# Altium footprint library EMDC_Packages.PcbLib: 274 footprints (part 10 of 18)
Each footprint in its own frame and in the unit in brackets; x right, y up, seen from the top. Pads: shape width x height; smd on the part's side, far side on the other; paste and mask are expansions set on the pad; w line width, h text height; cw(c..) or ccw(c..) is an arc to the next point about the centre after c.
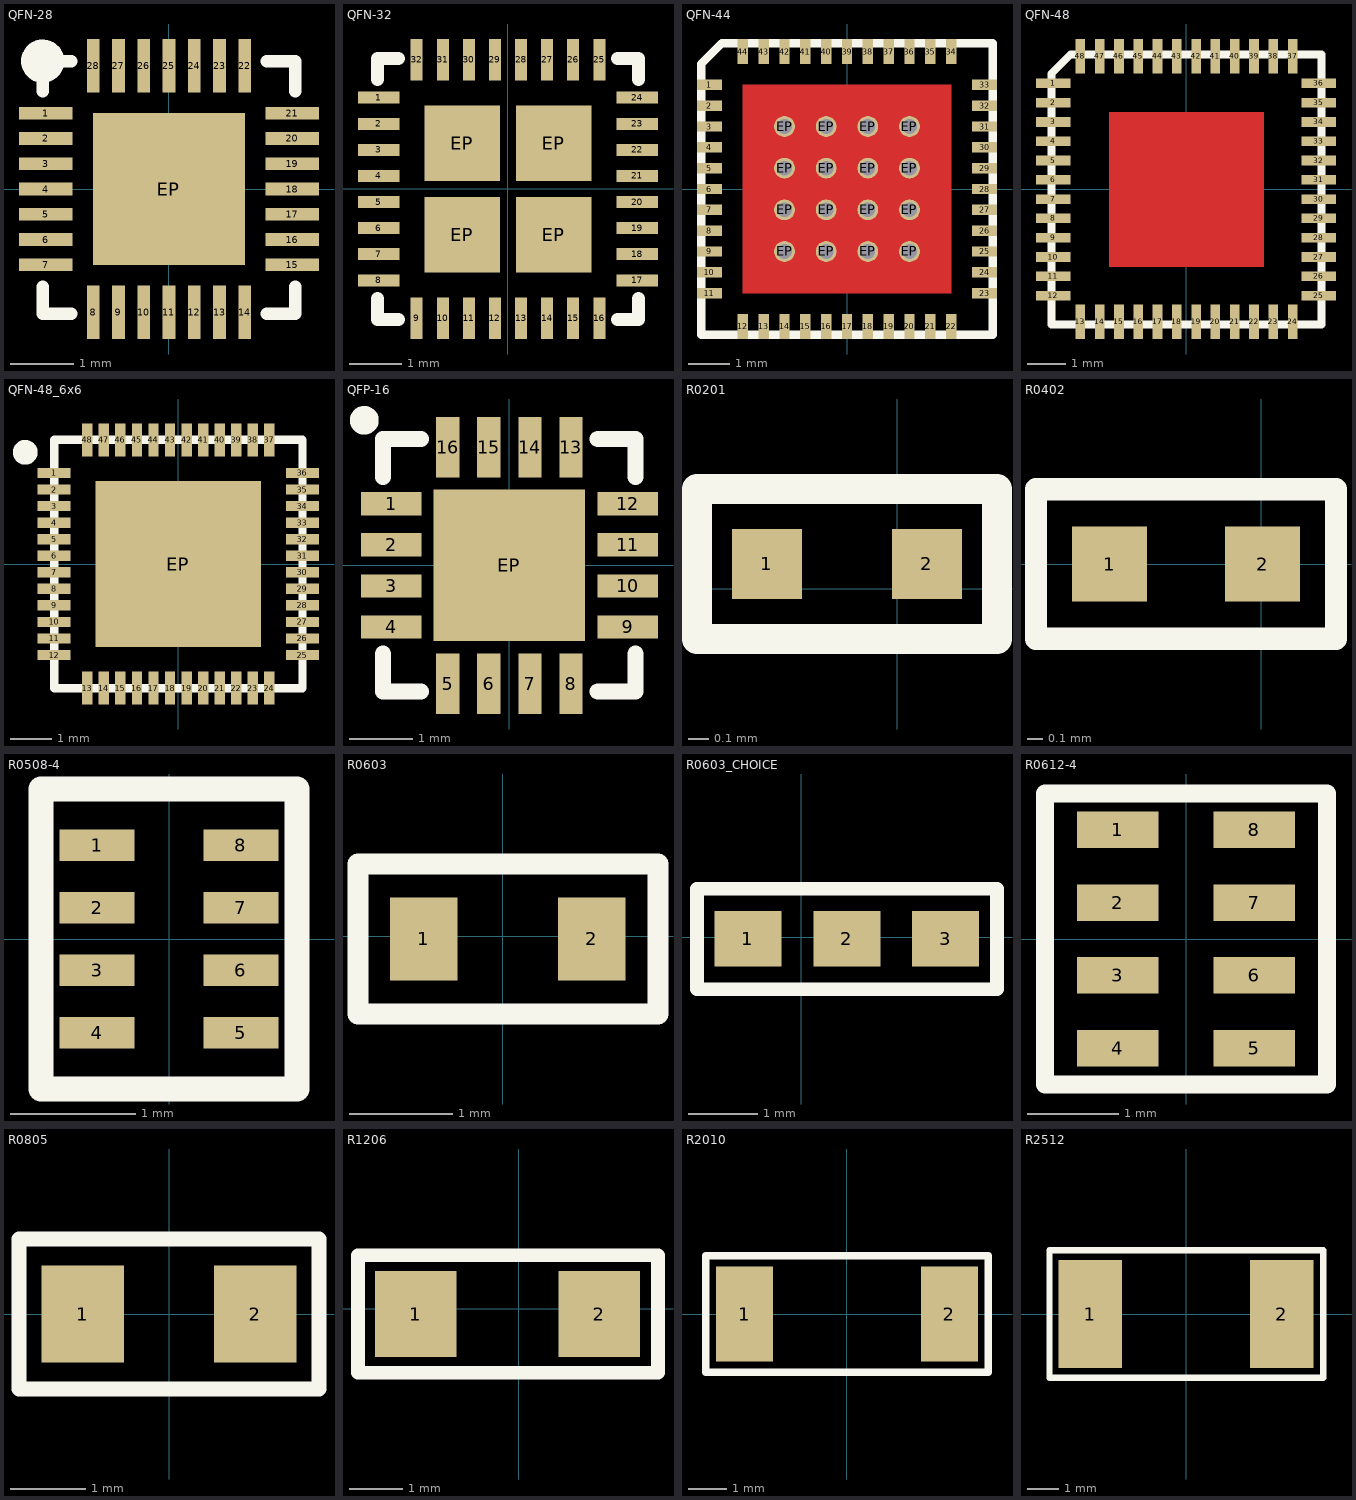
[diagram p9: the footprints below, top view; thin cyan lines are the x and y axes]

## QFN-28 [mm] "QFN-28"
pads (29):
  rect 0.85x0.2 smd: 1(-1.95,1.2) 2(-1.95,0.8) 3(-1.95,0.4) 4(-1.95,0) 5(-1.95,-0.4) 6(-1.95,-0.8) 7(-1.95,-1.2) 15(1.95,-1.2) 16(1.95,-0.8) 17(1.95,-0.4) 18(1.95,0) 19(1.95,0.4) 20(1.95,0.8) 21(1.95,1.2)
  rect 0.2x0.85 smd: 8(-1.2,-1.95) 9(-0.8,-1.95) 10(-0.4,-1.95) 11(0,-1.95) 12(0.4,-1.95) 13(0.8,-1.95) 14(1.2,-1.95) 22(1.2,1.95) 23(0.8,1.95) 24(0.4,1.95) 25(0,1.95) 26(-0.4,1.95) 27(-0.8,1.95) 28(-1.2,1.95)
  rect 2.4x2.4 smd: EP(0,0)
Top Overlay:
  circle w0.254: c-2,2.025 r0.215
  lines w0.2: -2,-1.55 -2,-1.975 -1.55,-1.975 ; -2,1.55 -2,2.025 -1.55,2.025 ; 1.55,-1.975 2,-1.975 2,-1.55 ; 1.55,2.025 2,2.025 2,1.55
3D body "User Library-QFN28-0_4.STEP": height 0.75, standoff 0, extent -2,-1.975 2,2.025

## QFN-32 [mm]
pads (36):
  rect 0.8x0.23 smd: 1(-2.475,1.75) 2(-2.475,1.25) 3(-2.475,0.75) 4(-2.475,0.25) 5(-2.475,-0.25) 6(-2.475,-0.75) 7(-2.475,-1.25) 8(-2.475,-1.75) 17(2.475,-1.75) 18(2.475,-1.25) 19(2.475,-0.75) 20(2.475,-0.25) 21(2.475,0.25) 22(2.475,0.75) 23(2.475,1.25) 24(2.475,1.75)
  rect 0.23x0.8 smd: 9(-1.75,-2.475) 10(-1.25,-2.475) 11(-0.75,-2.475) 12(-0.25,-2.475) 13(0.25,-2.475) 14(0.75,-2.475) 15(1.25,-2.475) 16(1.75,-2.475) 25(1.75,2.475) 26(1.25,2.475) 27(0.75,2.475) 28(0.25,2.475) 29(-0.25,2.475) 30(-0.75,2.475) 31(-1.25,2.475) 32(-1.75,2.475)
  rect 1.45x1.45 smd: EP(-0.875,-0.875) EP(-0.875,0.875) EP(0.875,-0.875) EP(0.875,0.875)
Top Overlay:
  lines w0.254: -2.5,-2.1 -2.5,-2.5 -2.1,-2.5 ; -2.5,2.1 -2.5,2.5 -2.1,2.5 ; 2.1,-2.5 2.5,-2.5 2.5,-2.1 ; 2.1,2.5 2.5,2.5 2.5,2.1
3D body "User Library-QFN-32-5x5 - EQ.STEP": height 0.85, standoff 0, extent -2.5,-2.5 2.5,2.5

## QFN-44 [mm] "QFN 44pin 7x7mm"
pads (60):
  rect 0.6x0.25 smd: 1(-3.3,2.5) 2(-3.3,2) 3(-3.3,1.5) 4(-3.3,1) 5(-3.3,0.5) 6(-3.3,0) 7(-3.3,-0.5) 8(-3.3,-1) 9(-3.3,-1.5) 10(-3.3,-2) 11(-3.3,-2.5) 23(3.3,-2.5) 24(3.3,-2) 25(3.3,-1.5) 26(3.3,-1) 27(3.3,-0.5) 28(3.3,0) 29(3.3,0.5) 30(3.3,1) 31(3.3,1.5) 32(3.3,2) 33(3.3,2.5)
  rect 0.25x0.6 smd: 12(-2.5,-3.3) 13(-2,-3.3) 14(-1.5,-3.3) 15(-1,-3.3) 16(-0.5,-3.3) 17(0,-3.3) 18(0.5,-3.3) 19(1,-3.3) 20(1.5,-3.3) 21(2,-3.3) 22(2.5,-3.3) 34(2.5,3.3) 35(2,3.3) 36(1.5,3.3) 37(1,3.3) 38(0.5,3.3) 39(0,3.3) 40(-0.5,3.3) 41(-1,3.3) 42(-1.5,3.3) 43(-2,3.3) 44(-2.5,3.3)
  round 0.5 hole 0.35 paste+0 mask+0: EP(-1.5,-1.5) EP(-1.5,-0.5) EP(-1.5,0.5) EP(-1.5,1.5) EP(-0.5,-1.5) EP(-0.5,-0.5) EP(-0.5,0.5) EP(-0.5,1.5) EP(0.5,-1.5) EP(0.5,-0.5) EP(0.5,0.5) EP(0.5,1.5) EP(1.5,-1.5) EP(1.5,-0.5) EP(1.5,0.5) EP(1.5,1.5)
Top Layer:
  region: -2.5,2.5 -2.5,-2.5 2.5,-2.5 2.5,2.5
Top Overlay:
  lines w0.2: -3.5,-3.5 -3.5,3 -3,3.5 3.5,3.5 3.5,-3.5 -3.5,-3.5
Top Solder:
  region: -1.23,2.16 -2.16,2.16 -2.16,1.23 -1.23,1.23
  region: -0.1,1.23 -0.1,2.16 -1.03,2.16 -1.03,1.23
  region: 1.03,1.23 1.03,2.16 0.1,2.16 0.1,1.23
  region: 2.16,1.23 2.16,2.16 1.23,2.16 1.23,1.23
  region: -1.23,0.1 -1.23,1.03 -2.16,1.03 -2.16,0.1
  region: -0.1,0.1 -0.1,1.03 -1.03,1.03 -1.03,0.1
  region: 1.03,0.1 1.03,1.03 0.1,1.03 0.1,0.1
  region: 2.16,0.1 2.16,1.03 1.23,1.03 1.23,0.1
  region: -1.23,-1.03 -1.23,-0.1 -2.16,-0.1 -2.16,-1.03
  region: -0.1,-1.03 -0.1,-0.1 -1.03,-0.1 -1.03,-1.03
  region: 1.03,-1.03 1.03,-0.1 0.1,-0.1 0.1,-1.03
  region: 2.16,-1.03 2.16,-0.1 1.23,-0.1 1.23,-1.03
  region: -1.23,-2.16 -1.23,-1.23 -2.16,-1.23 -2.16,-2.16
  region: -0.1,-2.16 -0.1,-1.23 -1.03,-1.23 -1.03,-2.16
  region: 1.03,-2.16 1.03,-1.23 0.1,-1.23 0.1,-2.16
  region: 2.16,-2.16 2.16,-1.23 1.23,-1.23 1.23,-2.16
3D body "User Library-smd_qfn-44-2.STEP": height 0.9, standoff 0, extent -3.501,-3.501 3.501,3.501

## QFN-48 [mm]
pads (48):
  rect 0.9x0.25 smd: 1(-3.45,2.75) 2(-3.45,2.25) 3(-3.45,1.75) 4(-3.45,1.25) 5(-3.45,0.75) 6(-3.45,0.25) 7(-3.45,-0.25) 8(-3.45,-0.75) 9(-3.45,-1.25) 10(-3.45,-1.75) 11(-3.45,-2.25) 12(-3.45,-2.75) 25(3.425,-2.75) 26(3.425,-2.25) 27(3.425,-1.75) 28(3.425,-1.25) 29(3.425,-0.75) 30(3.425,-0.25) 31(3.425,0.25) 32(3.425,0.75) 33(3.425,1.25) 34(3.425,1.75) 35(3.425,2.25) 36(3.425,2.75)
  rect 0.25x0.9 smd: 13(-2.75,-3.425) 14(-2.25,-3.425) 15(-1.75,-3.425) 16(-1.25,-3.425) 17(-0.75,-3.425) 18(-0.25,-3.425) 19(0.25,-3.425) 20(0.75,-3.425) 21(1.25,-3.425) 22(1.75,-3.425) 23(2.25,-3.425) 24(2.75,-3.425) 37(2.75,3.45) 38(2.25,3.45) 39(1.75,3.45) 40(1.25,3.45) 41(0.75,3.45) 42(0.25,3.45) 43(-0.25,3.45) 44(-0.75,3.45) 45(-1.25,3.45) 46(-1.75,3.45) 47(-2.25,3.45) 48(-2.75,3.45)
Top Layer:
  region: -2,2 -2,-2 2,-2 2,2
Top Overlay:
  lines w0.2: -3.5,-3.5 3.5,-3.5 3.5,3.5 -3,3.5 -3.5,3 -3.5,-3.5
Top Solder:
  region: -1.23,2.16 -2.16,2.16 -2.16,1.23 -1.23,1.23
  region: -0.1,1.23 -0.1,2.16 -1.03,2.16 -1.03,1.23
  region: 1.03,1.23 1.03,2.16 0.1,2.16 0.1,1.23
  region: 2.16,1.23 2.16,2.16 1.23,2.16 1.23,1.23
  region: -1.23,0.1 -1.23,1.03 -2.16,1.03 -2.16,0.1
  region: -0.1,0.1 -0.1,1.03 -1.03,1.03 -1.03,0.1
  region: 1.03,0.1 1.03,1.03 0.1,1.03 0.1,0.1
  region: 2.16,0.1 2.16,1.03 1.23,1.03 1.23,0.1
  region: -1.23,-1.03 -1.23,-0.1 -2.16,-0.1 -2.16,-1.03
  region: -0.1,-1.03 -0.1,-0.1 -1.03,-0.1 -1.03,-1.03
  region: 1.03,-1.03 1.03,-0.1 0.1,-0.1 0.1,-1.03
  region: 2.16,-1.03 2.16,-0.1 1.23,-0.1 1.23,-1.03
  region: -1.23,-2.16 -1.23,-1.23 -2.16,-1.23 -2.16,-2.16
  region: -0.1,-2.16 -0.1,-1.23 -1.03,-1.23 -1.03,-2.16
  region: 1.03,-2.16 1.03,-1.23 0.1,-1.23 0.1,-2.16
  region: 2.16,-2.16 2.16,-1.23 1.23,-1.23 1.23,-2.16
3D body "User Library-QFN48_7x7.STEP": height 0.78, standoff -0.02, extent -3.5,-3.51 3.52,3.51

## QFN-48_6x6 [mm]
pads (49):
  rect 0.8x0.25 smd: 1(-3,2.2) 2(-3,1.8) 3(-3,1.4) 4(-3,1) 5(-3,0.6) 6(-3,0.2) 7(-3,-0.2) 8(-3,-0.6) 9(-3,-1) 10(-3,-1.4) 11(-3,-1.8) 12(-3,-2.2) 25(3,-2.2) 26(3,-1.8) 27(3,-1.4) 28(3,-1) 29(3,-0.6) 30(3,-0.2) 31(3,0.2) 32(3,0.6) 33(3,1) 34(3,1.4) 35(3,1.8) 36(3,2.2)
  rect 0.25x0.8 smd: 13(-2.2,-3) 14(-1.8,-3) 15(-1.4,-3) 16(-1,-3) 17(-0.6,-3) 18(-0.2,-3) 19(0.2,-3) 20(0.6,-3) 21(1,-3) 22(1.4,-3) 23(1.8,-3) 24(2.2,-3) 37(2.2,3) 38(1.8,3) 39(1.4,3) 40(1,3) 41(0.6,3) 42(0.2,3) 43(-0.2,3) 44(-0.6,3) 45(-1,3) 46(-1.4,3) 47(-1.8,3) 48(-2.2,3)
  rect 4x4 smd: EP(0,0)
Top Overlay:
  circle w0.3: c-3.7,2.7 r0.15
  lines w0.2: -3,-3 3,-3 3,3 -3,3 -3,-3
3D body "User Library-QFN48.step": height 0.85, standoff -0.02, extent -3.021,-3.016 3.019,3.024

## QFP-16 [mm]
pads (17):
  rect 0.96x0.37 smd: 1(-1.875,0.975) 2(-1.875,0.325) 3(-1.875,-0.325) 4(-1.875,-0.975) 9(1.875,-0.975) 10(1.875,-0.325) 11(1.875,0.325) 12(1.875,0.975)
  rect 0.37x0.96 smd: 5(-0.975,-1.875) 6(-0.325,-1.875) 7(0.325,-1.875) 8(0.975,-1.875) 13(0.975,1.875) 14(0.325,1.875) 15(-0.325,1.875) 16(-0.975,1.875)
  rect 2.4x2.4 smd: EP(0,0)
Top Overlay:
  circle w0.254: c-2.3,2.3 r0.1
  lines w0.254: -2,-1.4 -2,-2 -1.4,-2 ; -2,1.4 -2,2 -1.4,2 ; 1.4,-2 2,-2 2,-1.4 ; 1.4,2 2,2 2,1.4
3D body "User Library-qfn16-4x4with pad.STEP": height 0.92, standoff 0, extent -2,-2 2,2

## R0201 [mm] "SMD Body 0.6 x 0.3 mm (LxW typ)"
height 0.35
pads (2):
  rect 0.35x0.35 smd: 1(-0.65,0.125) 2(0.15,0.125)
Top Overlay:
  lines w0.15: -1,-0.25 -1,0.5 0.5,0.5 0.5,-0.25 -1,-0.25
3D body "User Library-res0201-1.STEP": height 0.23, standoff 0, extent -0.55,-0.025 0.05,0.275

## R0402 [mm]
pads (2):
  rect 0.5x0.5 smd: 1(-1.01,0) 2(0.01,0)
Top Overlay:
  lines w0.15: -1.5,-0.5 0.5,-0.5 0.5,0.5 -1.5,0.5 -1.5,-0.5
3D body "User Library-res0402-1.STEP": height 0.3, standoff 0, extent -1,-0.25 0,0.25

## R0508-4 [mm] "Resistor array (4 resistors)"
pads (8):
  rect 0.6x0.25 smd: 1(-0.575,0.75) 2(-0.575,0.25) 3(-0.575,-0.25) 4(-0.575,-0.75) 5(0.575,-0.75) 6(0.575,-0.25) 7(0.575,0.25) 8(0.575,0.75)
Top Overlay:
  lines w0.2: -1.025,-1.2 -1.025,1.2 1.025,1.2 1.025,-1.2 -1.025,-1.2
3D body "User Library-741C083.step": height 0.35, standoff -0.03, extent -0.502,-1 0.502,1

## R0603 [mm]
pads (2):
  rect 0.65x0.8 smd: 1(-0.765,-0.025) 2(0.86,-0.025)
Top Overlay:
  lines w0.2: -1.4,-0.75 -1.4,0.7 1.5,0.7 1.5,-0.75 -1.4,-0.75
3D body "User Library-Chip Resistor_0603 (1608).STEP": height 0.47, standoff 0, extent -0.725,-0.425 0.875,0.377

## R0603_CHOICE [mm] "0603 placement for choice line"
pads (3):
  rect 0.965x0.8 smd: 1(-0.765,-0.025) 2(0.66,-0.025) 3(2.085,-0.025)
Top Overlay:
  lines w0.2: -1.5,-0.75 2.825,-0.75 2.825,0.7 -1.5,0.7 -1.5,-0.75
3D body "User Library-Chip Resistor_0603 (1608).STEP": height 0.47, standoff 0, extent -0.825,-0.425 0.775,0.377

## R0612-4 [mm] "Resistor array (4 resistors)"
pads (8):
  rect 0.9x0.4 smd: 1(-0.75,1.2) 2(-0.75,0.4) 3(-0.75,-0.4) 4(-0.75,-1.2) 5(0.75,-1.2) 6(0.75,-0.4) 7(0.75,0.4) 8(0.75,1.2)
Top Overlay:
  lines w0.2: -1.55,-1.6 -1.55,1.6 1.55,1.6 1.55,-1.6 -1.55,-1.6
3D body "User Library-Array-1206-4Way-Var1.STEP": height 0.5, standoff 0, extent -0.8,-1.6 0.8,1.6

## R0805 [mm]
pads (2):
  rect 1.1x1.3 smd: 1(-1.15,0) 2(1.15,0)
Top Overlay:
  lines w0.2: -2,-1 2,-1 2,1 -2,1 -2,-1
3D body "User Library-CRS0805.STEP": height 0.5, standoff 0, extent -1,-0.625 1,0.625

## R1206 [mm]
pads (2):
  rect 1.52x1.6 smd: 1(-1.925,-0.1) 2(1.5,-0.1)
Top Overlay:
  lines w0.254: -3,-1.2 -3,1 2.6,1 2.6,-1.2 -3,-1.2
3D body "User Library-CRS1206.STEP": height 0.55, standoff 0, extent -1.75,-0.9 1.35,0.7

## R2010 [mm] "SMD Body 5 x 2.5 mm (LxW typ)"
height 0.5
pads (2):
  rect 1.5x2.5 smd: 1(-2.675,0) 2(2.7,0)
Top Overlay:
  lines w0.2: -3.7,-1.525 3.725,-1.525 3.725,1.525 -3.7,1.525 -3.7,-1.525
3D body "User Library-R2010-1.STEP": height 0.55, standoff 0, extent -2.5,-1.26 2.5,1.26

## R2512 [mm]
pads (2):
  rect 2x3.4 smd: 1(-3.025,0) 2(3,0)
Top Overlay:
  lines w0.2: -4.3,-2 -4.3,2 4.3,2 4.3,-2 -4.3,-2
3D body "User Library-Resistors2512.STEP": height 0.61, standoff -0.01, extent -3.225,-1.612 3.225,1.613